# Altium integrated library ALTIUM-WR-TBL_RISING_CLAMP_SYSTEM-rev18a.IntLib: 432 symbols (part 1 of 2) (continued)
## 691241610005 (continued)
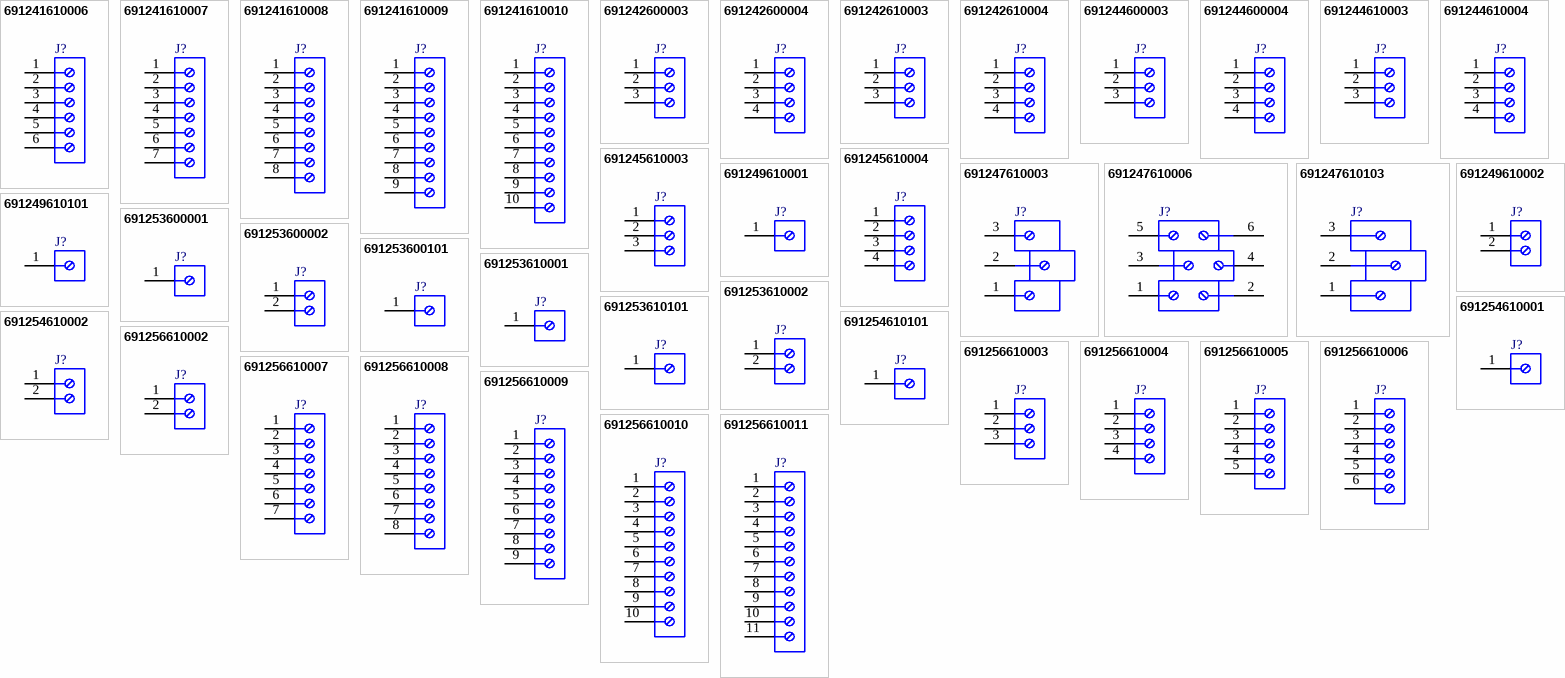
[diagram p4: symbols 691241610006 to 691256610011]

## 691241610006
designator J?
Serie 2416 - 10.16 mm Horizontal Entry with Rising Cage Clamp WR-TBL, 6 pin; Part Number: 691241610006; Pin Number: 6; ComponentLink1Description: Manufacturer; ComponentLink1URL: http://www.we-online.de; ComponentLink2Description: Datasheet; ComponentLink2URL: http://katalog.we-online.de/em/datasheet/691241610006.pdf; Published Date: June 2018; Publisher: Wurth Elektronik; Pitch: 10.16 mm; Operating Temperature: -30 to 120 degC; Mounting Technology: THT; Packaging: Box
footprint 691241610006
pins: 1, 2, 3, 4, 5, 6

## 691241610007
designator J?
Serie 2416 - 10.16 mm Horizontal Entry with Rising Cage Clamp WR-TBL, 7 pin; Part Number: 691241610007; Pin Number: 7; ComponentLink1Description: Manufacturer; ComponentLink1URL: http://www.we-online.de; ComponentLink2Description: Datasheet; ComponentLink2URL: http://katalog.we-online.de/em/datasheet/691241610007.pdf; Published Date: June 2018; Publisher: Wurth Elektronik; Pitch: 10.16 mm; Operating Temperature: -30 to 120 degC; Mounting Technology: THT; Packaging: Box
footprint 691241610007
pins: 1, 2, 3, 4, 5, 6, 7

## 691241610008
designator J?
Serie 2416 - 10.16 mm Horizontal Entry with Rising Cage Clamp WR-TBL, 8 pin; Part Number: 691241610008; Pin Number: 8; ComponentLink1Description: Manufacturer; ComponentLink1URL: http://www.we-online.de; ComponentLink2Description: Datasheet; ComponentLink2URL: http://katalog.we-online.de/em/datasheet/691241610008.pdf; Published Date: June 2018; Publisher: Wurth Elektronik; Pitch: 10.16 mm; Operating Temperature: -30 to 120 degC; Mounting Technology: THT; Packaging: Box
footprint 691241610008
pins: 1, 2, 3, 4, 5, 6, 7, 8

## 691241610009
designator J?
Serie 2416 - 10.16 mm Horizontal Entry with Rising Cage Clamp WR-TBL, 9 pin; Part Number: 691241610009; Pin Number: 9; ComponentLink1Description: Manufacturer; ComponentLink1URL: http://www.we-online.de; ComponentLink2Description: Datasheet; ComponentLink2URL: http://katalog.we-online.de/em/datasheet/691241610009.pdf; Published Date: June 2018; Publisher: Wurth Elektronik; Pitch: 10.16 mm; Operating Temperature: -30 to 120 degC; Mounting Technology: THT; Packaging: Box
footprint 691241610009
pins: 1, 2, 3, 4, 5, 6, 7, 8, 9

## 691241610010
designator J?
Serie 2416 - 10.16 mm Horizontal Entry with Rising Cage Clamp WR-TBL, 10 pin; Part Number: 691241610010; Pin Number: 10; ComponentLink1Description: Manufacturer; ComponentLink1URL: http://www.we-online.de; ComponentLink2Description: Datasheet; ComponentLink2URL: http://katalog.we-online.de/em/datasheet/691241610010.pdf; Published Date: June 2018; Publisher: Wurth Elektronik; Pitch: 10.16 mm; Operating Temperature: -30 to 120 degC; Mounting Technology: THT; Packaging: Box
footprint 691241610010
pins: 1, 2, 3, 4, 5, 6, 7, 8, 9, 10

## 691242600003
designator J?
Serie 2426 - 10.16 mm Vertical Entry Modular with Rising Cage Clamp WR-TBL, 3 pin; Part Number: 691242600003; Pin Number: 3; ComponentLink1Description: Manufacturer; ComponentLink1URL: http://www.we-online.de; ComponentLink2Description: Datasheet; ComponentLink2URL: http://katalog.we-online.de/em/datasheet/691242600003.pdf; Published Date: June 2018; Publisher: Wurth Elektronik; Pitch: 10.16 mm; Operating Temperature: -30 to 120 degC; Mounting Technology: THT; Packaging: Box
footprint 691242600003
pins: 1, 2, 3

## 691242600004
designator J?
Serie 2426 - 10.16 mm Vertical Entry Modular with Rising Cage Clamp WR-TBL, 4 pin; Part Number: 691242600004; Pin Number: 4; ComponentLink1Description: Manufacturer; ComponentLink1URL: http://www.we-online.de; ComponentLink2Description: Datasheet; ComponentLink2URL: http://katalog.we-online.de/em/datasheet/691242600004.pdf; Published Date: June 2018; Publisher: Wurth Elektronik; Pitch: 10.16 mm; Operating Temperature: -30 to 120 degC; Mounting Technology: THT; Packaging: Box
footprint 691242600004
pins: 1, 2, 3, 4

## 691242610003
designator J?
Serie 2426 - 10.16 mm Horizontal Entry Modular with Rising Cage Clamp WR-TBL, 3 pin; Part Number: 691242610003; Pin Number: 3; ComponentLink1Description: Manufacturer; ComponentLink1URL: http://www.we-online.de; ComponentLink2Description: Datasheet; ComponentLink2URL: http://katalog.we-online.de/em/datasheet/691242610003.pdf; Published Date: June 2018; Publisher: Wurth Elektronik; Pitch: 10.16 mm; Operating Temperature: -30 to 120 degC; Mounting Technology: THT; Packaging: Box
footprint 691242610003
pins: 1, 2, 3

## 691242610004
designator J?
Serie 2426 - 10.16 mm Horizontal Entry Modular with Rising Cage Clamp WR-TBL, 4 pin; Part Number: 691242610004; Pin Number: 4; ComponentLink1Description: Manufacturer; ComponentLink1URL: http://www.we-online.de; ComponentLink2Description: Datasheet; ComponentLink2URL: http://katalog.we-online.de/em/datasheet/691242610004.pdf; Published Date: June 2018; Publisher: Wurth Elektronik; Pitch: 10.16 mm; Operating Temperature: -30 to 120 degC; Mounting Technology: THT; Packaging: Box
footprint 691242610004
pins: 1, 2, 3, 4

## 691244600003
designator J?
Serie 2446 - 10.16 mm Vertical Entry Modular with Rising Clamp WR-TBL, 3 pin; Part Number: 691244600003; Pin Number: 3; ComponentLink1Description: Manufacturer; ComponentLink1URL: http://www.we-online.de; ComponentLink2Description: Datasheet; ComponentLink2URL: http://katalog.we-online.de/em/datasheet/6912446000xx.pdf; Published Date: June 2018; Publisher: Wurth Elektronik; Pitch: 10.16 mm; Operating Temperature: -30 to 120 degC; Mounting Technology: THT; Packaging: Box
footprint 691244600003
pins: 1, 2, 3

## 691244600004
designator J?
Serie 2446 - 10.16 mm Vertical Entry Modular with Rising Clamp WR-TBL, 4 pin; Part Number: 691244600004; Pin Number: 4; ComponentLink1Description: Manufacturer; ComponentLink1URL: http://www.we-online.de; ComponentLink2Description: Datasheet; ComponentLink2URL: http://katalog.we-online.de/em/datasheet/6912446000xx.pdf; Published Date: June 2018; Publisher: Wurth Elektronik; Pitch: 10.16 mm; Operating Temperature: -30 to 120 degC; Mounting Technology: THT; Packaging: Box
footprint 691244600004
pins: 1, 2, 3, 4

## 691244610003
designator J?
Serie 2446 - 10.16 mm Horizontal Entry Modular with Rising Cage Clamp WR-TBL, 3 pin; Part Number: 691244610003; Pin Number: 3; ComponentLink1Description: Manufacturer; ComponentLink1URL: http://www.we-online.de; ComponentLink2Description: Datasheet; ComponentLink2URL: http://katalog.we-online.de/em/datasheet/6912446100xx.pdf; Published Date: June 2018; Publisher: Wurth Elektronik; Pitch: 10.16 mm; Operating Temperature: -30 to 120 degC; Mounting Technology: THT; Packaging: Box
footprint 691244610003
pins: 1, 2, 3

## 691244610004
designator J?
Serie 2446 - 10.16 mm Horizontal Entry Modular with Rising Cage Clamp WR-TBL, 4 pin; Part Number: 691244610004; Pin Number: 4; ComponentLink1Description: Manufacturer; ComponentLink1URL: http://www.we-online.de; ComponentLink2Description: Datasheet; ComponentLink2URL: http://katalog.we-online.de/em/datasheet/6912446100xx.pdf; Published Date: June 2018; Publisher: Wurth Elektronik; Pitch: 10.16 mm; Operating Temperature: -30 to 120 degC; Mounting Technology: THT; Packaging: Box
footprint 691244610004
pins: 1, 2, 3, 4

## 691245610003
designator J?
Serie 2456 - 10.16 mm Horizontal Entry with Rising Cage Clamp WR-TBL, 3 pin; Part Number: 691245610003; Pin Number: 3; ComponentLink1Description: Manufacturer; ComponentLink1URL: http://www.we-online.de; ComponentLink2Description: Datasheet; ComponentLink2URL: http://katalog.we-online.de/em/datasheet/6912456100xx.pdf; Published Date: June 2018; Publisher: Wurth Elektronik; Pitch: 10.16 mm; Operating Temperature: -30 to 120 degC; Mounting Technology: THT; Packaging: Box
footprint 691245610003
pins: 1, 2, 3

## 691245610004
designator J?
Serie 2456 - 10.16 mm Horizontal Entry with Rising Cage Clamp WR-TBL, 4 pin; Part Number: 691245610004; Pin Number: 4; ComponentLink1Description: Manufacturer; ComponentLink1URL: http://www.we-online.de; ComponentLink2Description: Datasheet; ComponentLink2URL: http://katalog.we-online.de/em/datasheet/6912456100xx.pdf; Published Date: June 2018; Publisher: Wurth Elektronik; Pitch: 10.16 mm; Operating Temperature: -30 to 120 degC; Mounting Technology: THT; Packaging: Box
footprint 691245610004
pins: 1, 2, 3, 4

## 691247610003
designator J?
Serie 2476 - 10.16 mm Horizontal Entry with Rising Cage Clamp WR-TBL, 3 pin; Part Number: 691247610003; Pin Number: 3; ComponentLink1Description: Manufacturer; ComponentLink1URL: http://www.we-online.de; ComponentLink2Description: Datasheet; ComponentLink2URL: http://katalog.we-online.de/em/datasheet/691247610003.pdf; Published Date: June 2018; Publisher: Wurth Elektronik; Pitch: 10.16 mm; Operating Temperature: -30 to 120 degC; Mounting Technology: THT; Packaging: Box
footprint 691247610003
pins: 1, 2, 3

## 691247610006
designator J?
Serie 2476 - 10.16 mm Horizontal Entry with Rising Cage Clamp WR-TBL, 6 pin; Part Number: 691247610006; Pin Number: 6; ComponentLink1Description: Manufacturer; ComponentLink1URL: http://www.we-online.de; ComponentLink2Description: Datasheet; ComponentLink2URL: http://katalog.we-online.de/em/datasheet/691247610006.pdf; Published Date: June 2018; Publisher: Wurth Elektronik; Pitch: 10.16 mm; Operating Temperature: -30 to 120 degC; Mounting Technology: THT; Packaging: Box
footprint 691247610006
pins: 1, 2, 3, 4, 5, 6

## 691247610103
designator J?
Serie 2476 - 10.16 mm Horizontal Entry with Rising Cage Clamp WR-TBL, 3 pin; Part Number: 691247610103; Pin Number: 3; ComponentLink1Description: Manufacturer; ComponentLink1URL: http://www.we-online.de; ComponentLink2Description: Datasheet; ComponentLink2URL: http://katalog.we-online.de/em/datasheet/691247610103.pdf; Published Date: June 2018; Publisher: Wurth Elektronik; Pitch: 10.16 mm; Operating Temperature: -30 to 120 degC; Mounting Technology: THT; Packaging: Box
footprint 691247610103
pins: 1, 2, 3

## 691249610001
designator J?
Serie 2496 - 10.16 mm Horizontal Entry with Rising Cage Clamp WR-TBL, 1 pin; Part Number: 691249610001; Pin Number: 1; ComponentLink1Description: Manufacturer; ComponentLink1URL: http://www.we-online.de; ComponentLink2Description: Datasheet; ComponentLink2URL: http://katalog.we-online.de/em/datasheet/691249610001.pdf; Published Date: June 2018; Publisher: Wurth Elektronik; Pitch: 10.16 mm; Operating Temperature: -30 to 120 degC; Mounting Technology: THT; Packaging: Box
footprint 691249610001
pins: 1

## 691249610002
designator J?
Serie 2496 - 10.16 mm Horizontal Entry with Rising Cage Clamp WR-TBL, 2 pin; Part Number: 691249610002; Pin Number: 2; ComponentLink1Description: Manufacturer; ComponentLink1URL: http://www.we-online.de; ComponentLink2Description: Datasheet; ComponentLink2URL: http://katalog.we-online.de/em/datasheet/691249610002.pdf; Published Date: June 2018; Publisher: Wurth Elektronik; Pitch: 10.16 mm; Operating Temperature: -30 to 120 degC; Mounting Technology: THT; Packaging: Box
footprint 691249610002
pins: 1, 2

## 691249610101
designator J?
Serie 2496 - 10.16 mm Horizontal Entry with Rising Cage Clamp WR-TBL, 1 pin; Part Number: 691249610101; Pin Number: 1; ComponentLink1Description: Manufacturer; ComponentLink1URL: http://www.we-online.de; ComponentLink2Description: Datasheet; ComponentLink2URL: http://katalog.we-online.de/em/datasheet/691249610101.pdf; Published Date: June 2018; Publisher: Wurth Elektronik; Pitch: 10.16 mm; Operating Temperature: -30 to 120 degC; Mounting Technology: THT; Packaging: Box
footprint 691249610101
pins: 1

## 691253600001
designator J?
Serie 2536 - 10.16 mm Vertical Entry Modular with Rising Cage Clamp WR-TBL, 1 pin; Part Number: 691253600001; Pin Number: 1; ComponentLink1Description: Manufacturer; ComponentLink1URL: http://www.we-online.de; ComponentLink2Description: Datasheet; ComponentLink2URL: http://katalog.we-online.de/em/datasheet/6912536000xx.pdf; Published Date: June 2018; Publisher: Wurth Elektronik; Pitch: 10.16 mm; Operating Temperature: -30 to 120 degC; Mounting Technology: THT; Packaging: Box
footprint 691253600001
pins: 1

## 691253600002
designator J?
Serie 2536 - 10.16 mm Vertical Entry Modular with Rising Cage Clamp WR-TBL, 2 pin; Part Number: 691253600002; Pin Number: 2; ComponentLink1Description: Manufacturer; ComponentLink1URL: http://www.we-online.de; ComponentLink2Description: Datasheet; ComponentLink2URL: http://katalog.we-online.de/em/datasheet/6912536000xx.pdf; Published Date: June 2018; Publisher: Wurth Elektronik; Pitch: 10.16 mm; Operating Temperature: -30 to 120 degC; Mounting Technology: THT; Packaging: Box
footprint 691253600002
pins: 1, 2

## 691253600101
designator J?
Serie 2536 - 10.16 mm Vertical Entry Modular with Rising Cage Clamp WR-TBL, 1 pin; Part Number: 691253600101; Pin Number: 1; ComponentLink1Description: Manufacturer; ComponentLink1URL: http://www.we-online.de; ComponentLink2Description: Datasheet; ComponentLink2URL: http://katalog.we-online.de/em/datasheet/6912536000xx.pdf; Published Date: June 2018; Publisher: Wurth Elektronik; Pitch: 10.16 mm; Operating Temperature: -30 to 120 degC; Mounting Technology: THT; Packaging: Box
footprint 691253600101
pins: 1

## 691253610001
designator J?
Serie 2536 - 10.16 mm Horizontal Entry Modular with Rising Cage Clamp WR-TBL, 1 pin; Part Number: 691253610001; Pin Number: 1; ComponentLink1Description: Manufacturer; ComponentLink1URL: http://www.we-online.de; ComponentLink2Description: Datasheet; ComponentLink2URL: http://katalog.we-online.de/em/datasheet/6912536100xx.pdf; Published Date: June 2018; Publisher: Wurth Elektronik; Pitch: 10.16 mm; Operating Temperature: -30 to 120 degC; Mounting Technology: THT; Packaging: Box
footprint 691253610001
pins: 1

## 691253610002
designator J?
Serie 2536 - 10.16 mm Horizontal Entry Modular with Rising Cage Clamp WR-TBL, 2 pin; Part Number: 691253610002; Pin Number: 2; ComponentLink1Description: Manufacturer; ComponentLink1URL: http://www.we-online.de; ComponentLink2Description: Datasheet; ComponentLink2URL: http://katalog.we-online.de/em/datasheet/6912536100xx.pdf; Published Date: June 2018; Publisher: Wurth Elektronik; Pitch: 10.16 mm; Operating Temperature: -30 to 120 degC; Mounting Technology: THT; Packaging: Box
footprint 691253610002
pins: 1, 2

## 691253610101
designator J?
Serie 2536 - 10.16 mm Horizontal Entry Modular with Rising Cage Clamp WR-TBL, 1 pin; Part Number: 691253610101; Pin Number: 1; ComponentLink1Description: Manufacturer; ComponentLink1URL: http://www.we-online.de; ComponentLink2Description: Datasheet; ComponentLink2URL: http://katalog.we-online.de/em/datasheet/6912536100xx.pdf; Published Date: June 2018; Publisher: Wurth Elektronik; Pitch: 10.16 mm; Operating Temperature: -30 to 120 degC; Mounting Technology: THT; Packaging: Box
footprint 691253610101
pins: 1

## 691254610001
designator J?
Serie 2546 - 10.16 mm Horizontal Entry with Rising Cage Clamp WR-TBL, 1 pin; Part Number: 691254610001; Pin Number: 1; ComponentLink1Description: Manufacturer; ComponentLink1URL: http://www.we-online.de; ComponentLink2Description: Datasheet; ComponentLink2URL: http://katalog.we-online.de/em/datasheet/6912546100xx.pdf; Published Date: June 2018; Publisher: Wurth Elektronik; Pitch: 10.16 mm; Operating Temperature: -30 to 120 degC; Mounting Technology: THT; Packaging: Box
footprint 691254610001
pins: 1

## 691254610002
designator J?
Serie 2546 - 10.16 mm Horizontal Entry with Rising Cage Clamp WR-TBL, 2 pin; Part Number: 691254610002; Pin Number: 2; ComponentLink1Description: Manufacturer; ComponentLink1URL: http://www.we-online.de; ComponentLink2Description: Datasheet; ComponentLink2URL: http://katalog.we-online.de/em/datasheet/6912546100xx.pdf; Published Date: June 2018; Publisher: Wurth Elektronik; Pitch: 10.16 mm; Operating Temperature: -30 to 120 degC; Mounting Technology: THT; Packaging: Box
footprint 691254610002
pins: 1, 2

## 691254610101
designator J?
Serie 2546 - 10.16 mm Horizontal Entry with Rising Cage Clamp WR-TBL, 1 pin; Part Number: 691254610101; Pin Number: 1; ComponentLink1Description: Manufacturer; ComponentLink1URL: http://www.we-online.de; ComponentLink2Description: Datasheet; ComponentLink2URL: http://katalog.we-online.de/em/datasheet/6912546100xx.pdf; Published Date: June 2018; Publisher: Wurth Elektronik; Pitch: 10.16 mm; Operating Temperature: -30 to 120 degC; Mounting Technology: THT; Packaging: Box
footprint 691254610101
pins: 1

## 691256610002
designator J?
Serie 2566 - 10.16 mm Horizontal Entry with Rising Cage Clamp WR-TBL, 2 pin; Part Number: 691256610002; Pin Number: 2; ComponentLink1Description: Manufacturer; ComponentLink1URL: http://www.we-online.de; ComponentLink2Description: Datasheet; ComponentLink2URL: http://katalog.we-online.de/em/datasheet/691256610002.pdf; Published Date: June 2018; Publisher: Wurth Elektronik; Pitch: 10.16 mm; Operating Temperature: -30 to 120 degC; Mounting Technology: THT; Packaging: Box
footprint 691256610002
pins: 1, 2

## 691256610003
designator J?
Serie 2566 - 10.16 mm Horizontal Entry with Rising Cage Clamp WR-TBL, 3 pin; Part Number: 691256610003; Pin Number: 3; ComponentLink1Description: Manufacturer; ComponentLink1URL: http://www.we-online.de; ComponentLink2Description: Datasheet; ComponentLink2URL: http://katalog.we-online.de/em/datasheet/691256610003.pdf; Published Date: June 2018; Publisher: Wurth Elektronik; Pitch: 10.16 mm; Operating Temperature: -30 to 120 degC; Mounting Technology: THT; Packaging: Box
footprint 691256610003
pins: 1, 2, 3

## 691256610004
designator J?
Serie 2566 - 10.16 mm Horizontal Entry with Rising Cage Clamp WR-TBL, 4 pin; Part Number: 691256610004; Pin Number: 4; ComponentLink1Description: Manufacturer; ComponentLink1URL: http://www.we-online.de; ComponentLink2Description: Datasheet; ComponentLink2URL: http://katalog.we-online.de/em/datasheet/691256610004.pdf; Published Date: June 2018; Publisher: Wurth Elektronik; Pitch: 10.16 mm; Operating Temperature: -30 to 120 degC; Mounting Technology: THT; Packaging: Box
footprint 691256610004
pins: 1, 2, 3, 4

## 691256610005
designator J?
Serie 2566 - 10.16 mm Horizontal Entry with Rising Cage Clamp WR-TBL, 5 pin; Part Number: 691256610005; Pin Number: 5; ComponentLink1Description: Manufacturer; ComponentLink1URL: http://www.we-online.de; ComponentLink2Description: Datasheet; ComponentLink2URL: http://katalog.we-online.de/em/datasheet/691256610005.pdf; Published Date: June 2018; Publisher: Wurth Elektronik; Pitch: 10.16 mm; Operating Temperature: -30 to 120 degC; Mounting Technology: THT; Packaging: Box
footprint 691256610005
pins: 1, 2, 3, 4, 5

## 691256610006
designator J?
Serie 2566 - 10.16 mm Horizontal Entry with Rising Cage Clamp WR-TBL, 6 pin; Part Number: 691256610006; Pin Number: 6; ComponentLink1Description: Manufacturer; ComponentLink1URL: http://www.we-online.de; ComponentLink2Description: Datasheet; ComponentLink2URL: http://katalog.we-online.de/em/datasheet/691256610006.pdf; Published Date: June 2018; Publisher: Wurth Elektronik; Pitch: 10.16 mm; Operating Temperature: -30 to 120 degC; Mounting Technology: THT; Packaging: Box
footprint 691256610006
pins: 1, 2, 3, 4, 5, 6

## 691256610007
designator J?
Serie 2566 - 10.16 mm Horizontal Entry with Rising Cage Clamp WR-TBL, 7 pin; Part Number: 691256610007; Pin Number: 7; ComponentLink1Description: Manufacturer; ComponentLink1URL: http://www.we-online.de; ComponentLink2Description: Datasheet; ComponentLink2URL: http://katalog.we-online.de/em/datasheet/691256610007.pdf; Published Date: June 2018; Publisher: Wurth Elektronik; Pitch: 10.16 mm; Operating Temperature: -30 to 120 degC; Mounting Technology: THT; Packaging: Box
footprint 691256610007
pins: 1, 2, 3, 4, 5, 6, 7

## 691256610008
designator J?
Serie 2566 - 10.16 mm Horizontal Entry with Rising Cage Clamp WR-TBL, 8 pin; Part Number: 691256610008; Pin Number: 8; ComponentLink1Description: Manufacturer; ComponentLink1URL: http://www.we-online.de; ComponentLink2Description: Datasheet; ComponentLink2URL: http://katalog.we-online.de/em/datasheet/691256610008.pdf; Published Date: June 2018; Publisher: Wurth Elektronik; Pitch: 10.16 mm; Operating Temperature: -30 to 120 degC; Mounting Technology: THT; Packaging: Box
footprint 691256610008
pins: 1, 2, 3, 4, 5, 6, 7, 8

## 691256610009
designator J?
Serie 2566 - 10.16 mm Horizontal Entry with Rising Cage Clamp WR-TBL, 9 pin; Part Number: 691256610009; Pin Number: 9; ComponentLink1Description: Manufacturer; ComponentLink1URL: http://www.we-online.de; ComponentLink2Description: Datasheet; ComponentLink2URL: http://katalog.we-online.de/em/datasheet/691256610009.pdf; Published Date: June 2018; Publisher: Wurth Elektronik; Pitch: 10.16 mm; Operating Temperature: -30 to 120 degC; Mounting Technology: THT; Packaging: Box
footprint 691256610009
pins: 1, 2, 3, 4, 5, 6, 7, 8, 9

## 691256610010
designator J?
Serie 2566 - 10.16 mm Horizontal Entry with Rising Cage Clamp WR-TBL, 10 pin; Part Number: 691256610010; Pin Number: 10; ComponentLink1Description: Manufacturer; ComponentLink1URL: http://www.we-online.de; ComponentLink2Description: Datasheet; ComponentLink2URL: http://katalog.we-online.de/em/datasheet/691256610010.pdf; Published Date: June 2018; Publisher: Wurth Elektronik; Pitch: 10.16 mm; Operating Temperature: -30 to 120 degC; Mounting Technology: THT; Packaging: Box
footprint 691256610010
pins: 1, 2, 3, 4, 5, 6, 7, 8, 9, 10

## 691256610011
designator J?
Serie 2566 - 10.16 mm Horizontal Entry with Rising Cage Clamp WR-TBL, 11 pin; Part Number: 691256610011; Pin Number: 11; ComponentLink1Description: Manufacturer; ComponentLink1URL: http://www.we-online.de; ComponentLink2Description: Datasheet; ComponentLink2URL: http://katalog.we-online.de/em/datasheet/691256610011.pdf; Published Date: June 2018; Publisher: Wurth Elektronik; Pitch: 10.16 mm; Operating Temperature: -30 to 120 degC; Mounting Technology: THT; Packaging: Box
footprint 691256610011
pins: 1, 2, 3, 4, 5, 6, 7, 8, 9, 10, 11

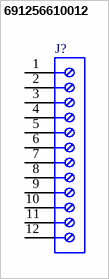
[diagram p5: symbol 691256610012]

## 691256610012
designator J?
Serie 2566 - 10.16 mm Horizontal Entry with Rising Cage Clamp WR-TBL, 12 pin; Part Number: 691256610012; Pin Number: 12; ComponentLink1Description: Manufacturer; ComponentLink1URL: http://www.we-online.de; ComponentLink2Description: Datasheet; ComponentLink2URL: http://katalog.we-online.de/em/datasheet/691256610012.pdf; Published Date: June 2018; Publisher: Wurth Elektronik; Pitch: 10.16 mm; Operating Temperature: -30 to 120 degC; Mounting Technology: THT; Packaging: Box
footprint 691256610012
pins: 1, 2, 3, 4, 5, 6, 7, 8, 9, 10, 11, 12


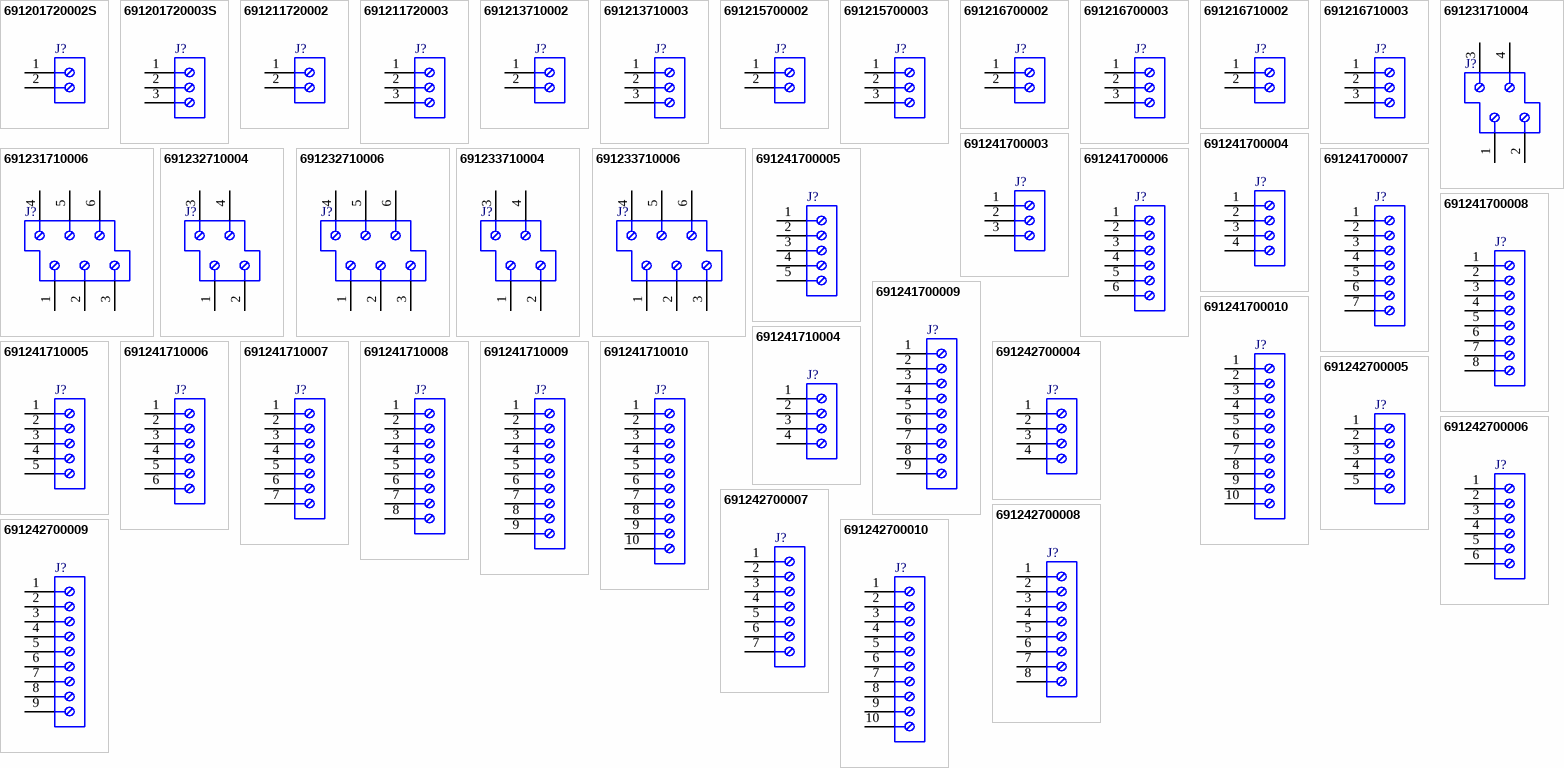
[diagram p6: symbols 691201720002S to 691242700010]

## 691201720002S
designator J?
Serie 201S - 5.00 mm 45deg Cable Entry Modular with Rising Cage Clamp WR-TBL, 2 pin; Part Number: 691201720002S; Pin Number: 2; Pitch: 5.00 mm; ComponentLink1Description: Manufacturer; ComponentLink1URL: http://www.we-online.de; ComponentLink2Description: Datasheet; ComponentLink2URL: http://katalog.we-online.de/em/datasheet/6912017200XXS.pdf; Published Date: June 2018; Publisher: Wurth Elektronik; Operating Temperature: -30 to 120 degC; Mounting Technology: THT; Packaging: Box
footprint 691201720002S
pins: 1, 2

## 691201720003S
designator J?
Serie 201S - 5.00 mm 45deg Cable Entry Modular with Rising Cage Clamp WR-TBL, 3 pin; Part Number: 691201720003S; Pin Number: 3; Pitch: 5.00 mm; ComponentLink1Description: Manufacturer; ComponentLink1URL: http://www.we-online.de; ComponentLink2Description: Datasheet; ComponentLink2URL: http://katalog.we-online.de/em/datasheet/6912017200XXS.pdf; Published Date: June 2018; Publisher: Wurth Elektronik; Operating Temperature: -30 to 120 degC; Mounting Technology: THT; Packaging: Box
footprint 691201720003S
pins: 1, 2, 3

## 691211720002
designator J?
Serie 211 - 5.00 mm 45deg Entry Modular with Rising Cage Clamp - 15.50 mm Height WR-TBL, 2 pin; Part Number: 691211720002; Pin Number: 2; Pitch: 5.00 mm; ComponentLink1Description: Manufacturer; ComponentLink1URL: http://www.we-online.de; ComponentLink2Description: Datasheet; ComponentLink2URL: http://katalog.we-online.de/em/datasheet/6912117200xx.pdf; Published Date: June 2018; Publisher: Wurth Elektronik; Operating Temperature: -40 to 105 degC; Mounting Technology: THT; Packaging: Box
footprint 691211720002
pins: 1, 2

## 691211720003
designator J?
Serie 211 - 5.00 mm 45deg Entry Modular with Rising Cage Clamp - 15.50 mm Height WR-TBL, 3 pin; Part Number: 691211720003; Pin Number: 3; Pitch: 5.00 mm; ComponentLink1Description: Manufacturer; ComponentLink1URL: http://www.we-online.de; ComponentLink2Description: Datasheet; ComponentLink2URL: http://katalog.we-online.de/em/datasheet/6912117200xx.pdf; Published Date: June 2018; Publisher: Wurth Elektronik; Operating Temperature: -40 to 105 degC; Mounting Technology: THT; Packaging: Box
footprint 691211720003
pins: 1, 2, 3

## 691213710002
designator J?
Serie 213 - 5.00 mm Horizontal Entry Modular with RisingCage Clamp WR-TBL, 2 pin; Part Number: 691213710002; Pin Number: 2; Pitch: 5.00 mm; ComponentLink1Description: Manufacturer; ComponentLink1URL: http://www.we-online.de; ComponentLink2Description: Datasheet; ComponentLink2URL: http://katalog.we-online.de/em/datasheet/6912137100xx.pdf; Published Date: June 2018; Publisher: Wurth Elektronik; Operating Temperature: -40 to 105 degC; Mounting Technology: THT; Packaging: Box
footprint 691213710002
pins: 1, 2

## 691213710003
designator J?
Serie 213 - 5.00 mm Horizontal Entry Modular with RisingCage Clamp WR-TBL, 3 pin; Part Number: 691213710003; Pin Number: 3; Pitch: 5.00 mm; ComponentLink1Description: Manufacturer; ComponentLink1URL: http://www.we-online.de; ComponentLink2Description: Datasheet; ComponentLink2URL: http://katalog.we-online.de/em/datasheet/6912137100xx.pdf; Published Date: June 2018; Publisher: Wurth Elektronik; Operating Temperature: -40 to 105 degC; Mounting Technology: THT; Packaging: Box
footprint 691213710003
pins: 1, 2, 3

## 691215700002
designator J?
Serie 2157 - 5.00 mm Vertical Entry Modular with Rising Cage Clamp WR-TBL, 2 pin; Part Number: 691215700002; Pin Number: 2; Pitch: 5.00 mm; ComponentLink1Description: Manufacturer; ComponentLink1URL: http://www.we-online.de; ComponentLink2Description: Datasheet; ComponentLink2URL: http://katalog.we-online.de/em/datasheet/6912157000xx.pdf; Published Date: June 2018; Publisher: Wurth Elektronik; Operating Temperature: -40 to 105 degC; Mounting Technology: THT; Packaging: Box
footprint 691215700002
pins: 1, 2

## 691215700003
designator J?
Serie 2157 - 5.00 mm Vertical Entry Modular with Rising Cage Clamp WR-TBL, 3 pin; Part Number: 691215700003; Pin Number: 3; Pitch: 5.00 mm; ComponentLink1Description: Manufacturer; ComponentLink1URL: http://www.we-online.de; ComponentLink2Description: Datasheet; ComponentLink2URL: http://katalog.we-online.de/em/datasheet/6912157000xx.pdf; Published Date: June 2018; Publisher: Wurth Elektronik; Operating Temperature: -40 to 105 degC; Mounting Technology: THT; Packaging: Box
footprint 691215700003
pins: 1, 2, 3

## 691216700002
designator J?
Serie 2167 - 5.00 mm Vertical Entry Modular with Rising Cage Clamp WR-TBL, 2 pin; Part Number: 691216700002; Pin Number: 2; Pitch: 5.00 mm; ComponentLink1Description: Manufacturer; ComponentLink1URL: http://www.we-online.de; ComponentLink2Description: Datasheet; ComponentLink2URL: http://katalog.we-online.de/em/datasheet/6912167000xx.pdf; Published Date: June 2018; Publisher: Wurth Elektronik; Operating Temperature: -30 to 120 degC; Mounting Technology: THT; Packaging: Box
footprint 691216700002
pins: 1, 2

## 691216700003
designator J?
Serie 2167 - 5.00 mm Vertical Entry Modular with Rising Cage Clamp WR-TBL, 3 pin; Part Number: 691216700003; Pin Number: 3; Pitch: 5.00 mm; ComponentLink1Description: Manufacturer; ComponentLink1URL: http://www.we-online.de; ComponentLink2Description: Datasheet; ComponentLink2URL: http://katalog.we-online.de/em/datasheet/6912167000xx.pdf; Published Date: June 2018; Publisher: Wurth Elektronik; Operating Temperature: -30 to 120 degC; Mounting Technology: THT; Packaging: Box
footprint 691216700003
pins: 1, 2, 3

## 691216710002
designator J?
Serie 2167 - 5.00 mm Horizontal Cable Entry Modular with Rising Cage Clamp WR-TBL, 2 pin; Part Number: 691216710002; Pin Number: 2; Pitch: 5.00 mm; ComponentLink1Description: Manufacturer; ComponentLink1URL: http://www.we-online.de; ComponentLink2Description: Datasheet; ComponentLink2URL: http://katalog.we-online.de/em/datasheet/6912167100XX.pdf; Published Date: June 2018; Publisher: Wurth Elektronik; Operating Temperature: -30 to 120 degC; Mounting Technology: THT; Packaging: Box
footprint 691216710002
pins: 1, 2

## 691216710003
designator J?
Serie 2167 - 5.00 mm Horizontal Cable Entry Modular with Rising Cage Clamp WR-TBL, 3 pin; Part Number: 691216710003; Pin Number: 3; Pitch: 5.00 mm; ComponentLink1Description: Manufacturer; ComponentLink1URL: http://www.we-online.de; ComponentLink2Description: Datasheet; ComponentLink2URL: http://katalog.we-online.de/em/datasheet/6912167100XX.pdf; Published Date: June 2018; Publisher: Wurth Elektronik; Operating Temperature: -30 to 120 degC; Mounting Technology: THT; Packaging: Box
footprint 691216710003
pins: 1, 2, 3

## 691231710004
designator J?
Serie 2317 - 5.00 mm Double Level Horizontal Entry Modular with Rising Cage WR-TBL, 4 pin; Part Number: 691231710004; Pin Number: 4; Pitch: 5.00 mm; ComponentLink1Description: Manufacturer; ComponentLink1URL: http://www.we-online.de; ComponentLink2Description: Datasheet; ComponentLink2URL: http://katalog.we-online.de/em/datasheet/6912317100xx.pdf; Published Date: June 2018; Publisher: Wurth Elektronik; Operating Temperature: -40 to 105 degC; Mounting Technology: THT; Packaging: Box
footprint 691231710004
pins: 1, 2, 3, 4

## 691231710006
designator J?
Serie 2317 - 5.00 mm Double Level Horizontal Entry Modular with Rising Cage WR-TBL, 6 pin; Part Number: 691231710006; Pin Number: 6; Pitch: 5.00 mm; ComponentLink1Description: Manufacturer; ComponentLink1URL: http://www.we-online.de; ComponentLink2Description: Datasheet; ComponentLink2URL: http://katalog.we-online.de/em/datasheet/6912317100xx.pdf; Published Date: June 2018; Publisher: Wurth Elektronik; Operating Temperature: -40 to 105 degC; Mounting Technology: THT; Packaging: Box
footprint 691231710006
pins: 1, 2, 3, 4, 5, 6

## 691232710004
designator J?
Serie 2327 - 5.00 mm Double Level Horizontal Entry Modular with Rising Cage WR-TBL, 4 pin; Part Number: 691232710004; Pin Number: 4; Pitch: 5.00 mm; ComponentLink1Description: Manufacturer; ComponentLink1URL: http://www.we-online.de; ComponentLink2Description: Datasheet; ComponentLink2URL: http://katalog.we-online.de/em/datasheet/6912327100xx.pdf; Published Date: June 2018; Publisher: Wurth Elektronik; Operating Temperature: -40 to 105 degC; Mounting Technology: THT; Packaging: Box
footprint 691232710004
pins: 1, 2, 3, 4

## 691232710006
designator J?
Serie 2327 - 5.00 mm Double Level Horizontal Entry Modular with Rising Cage WR-TBL, 6 pin; Part Number: 691232710006; Pin Number: 6; Pitch: 5.00 mm; ComponentLink1Description: Manufacturer; ComponentLink1URL: http://www.we-online.de; ComponentLink2Description: Datasheet; ComponentLink2URL: http://katalog.we-online.de/em/datasheet/6912327100xx.pdf; Published Date: June 2018; Publisher: Wurth Elektronik; Operating Temperature: -40 to 105 degC; Mounting Technology: THT; Packaging: Box
footprint 691232710006
pins: 1, 2, 3, 4, 5, 6

## 691233710004
designator J?
Serie 2337 - 5.00 mm Double Level Horizontal Entry Modular with Rising Cage WR-TBL, 4 pin; Part Number: 691233710004; Pin Number: 4; Pitch: 5.00 mm; ComponentLink1Description: Manufacturer; ComponentLink1URL: http://www.we-online.de; ComponentLink2Description: Datasheet; ComponentLink2URL: http://katalog.we-online.de/em/datasheet/6912337100xx.pdf; Published Date: June 2018; Publisher: Wurth Elektronik; Operating Temperature: -40 to 105 degC; Mounting Technology: THT; Packaging: Box
footprint 691233710004
pins: 1, 2, 3, 4
